# Altium footprint library 1MaxPcb.PcbLib: 187 footprints (part 10 of 12)
Each footprint in its own frame and in the unit in brackets; x right, y up, seen from the top. Pads: shape width x height; smd on the part's side, far side on the other; paste and mask are expansions set on the pad; w line width, h text height; cw(c..) or ccw(c..) is an arc to the next point about the centre after c.
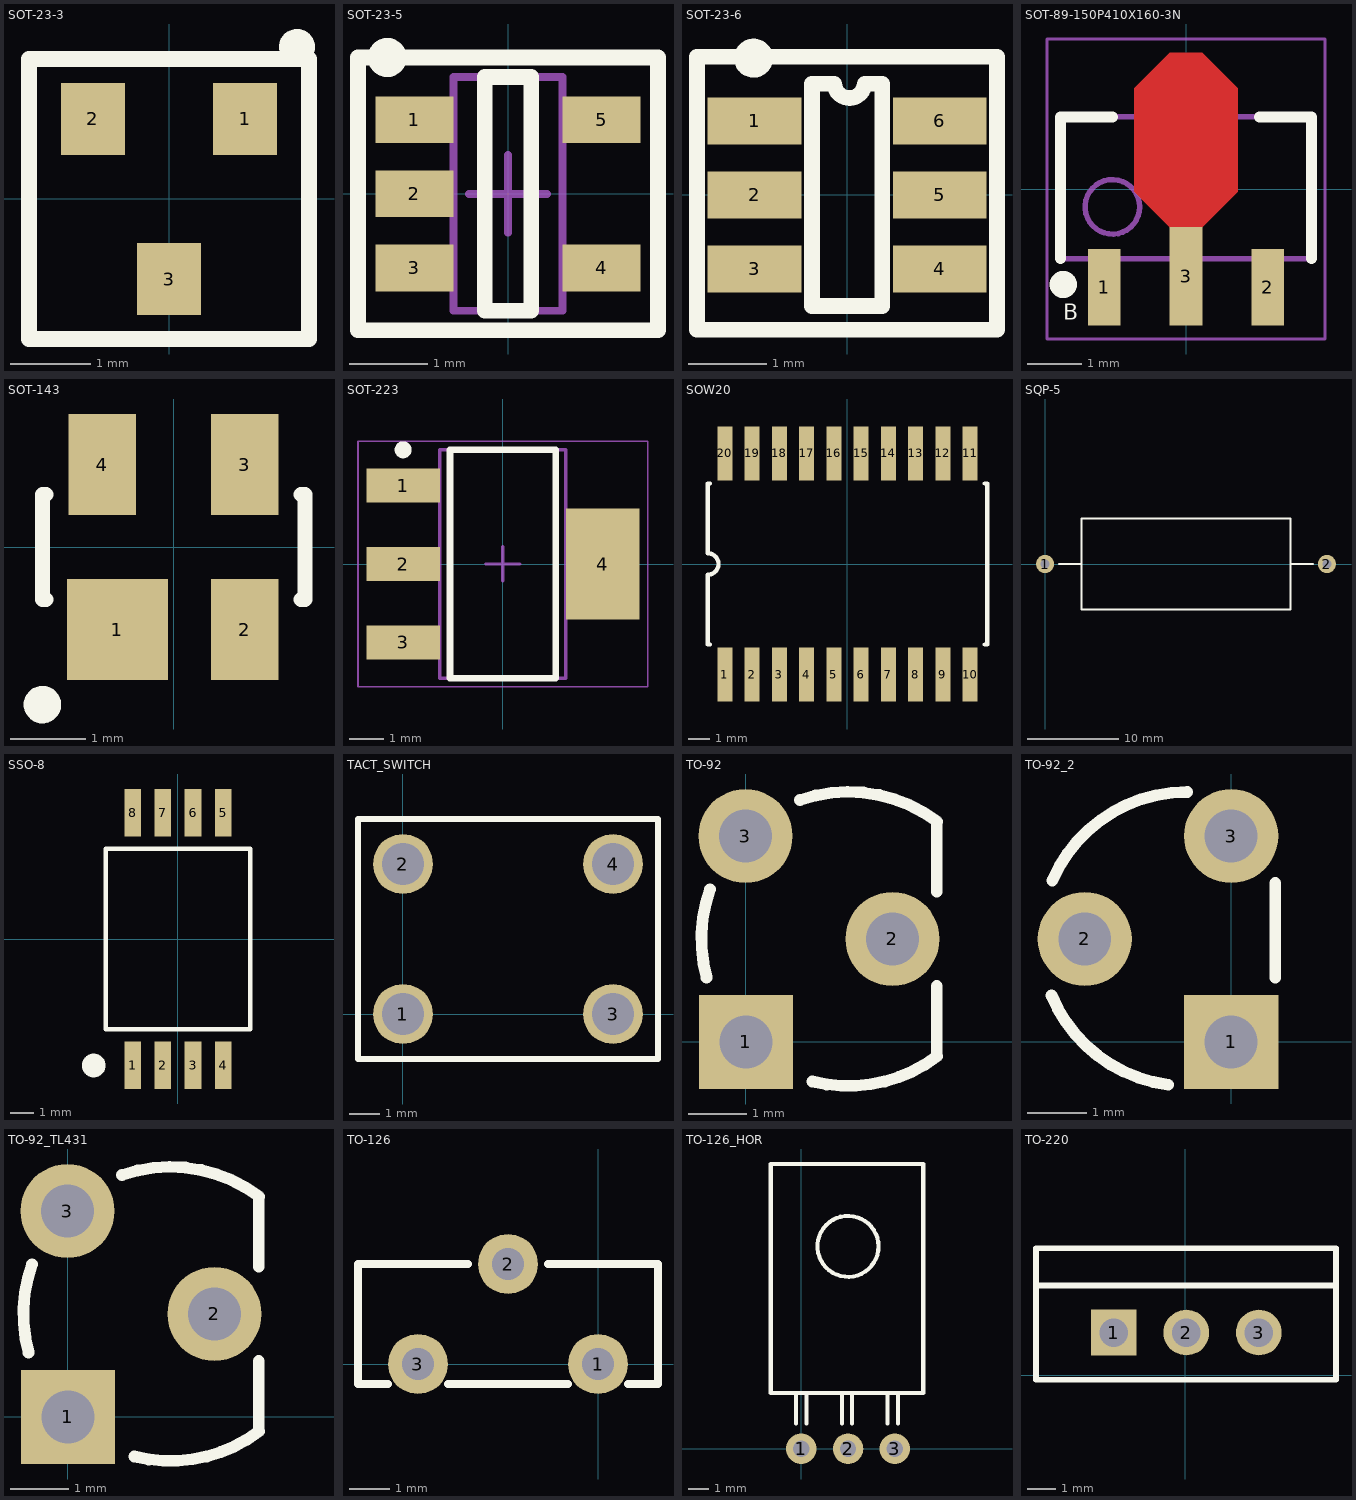
[diagram p9: the footprints below, top view; thin cyan lines are the x and y axes]

## SOT-23-3 [mm]
height 1.11
pads (3):
  rect 0.8x0.9 smd: 1(0.95,1) 2(-0.95,1) 3(0,-1)
Top Overlay:
  circle w0.25: c1.6,1.9 r0.1
  lines w0.2: -1.75,-1.75 1.75,-1.75 1.75,1.75 -1.5,1.75 -1.75,1.75 -1.75,-1.75
3D body "User Library-SOT-23-3-1.STEP": height 1.1, standoff 0, extent -1.5,-1.26 1.5,1.282

## SOT-23-5 [mm] "SOT23, 5-Leads, Body 2,90x2,45mm, Pitch 0,95mm, IPC Medium Density"
height 1.1
pads (5):
  rect 1x0.6 smd: 1(-1.2,0.95) 2(-1.2,0) 3(-1.2,-0.95) 4(1.2,-0.95) 5(1.2,0.95)
Top Overlay:
  circle w0.25: c-1.55,1.75 r0.125
  lines w0.2: -1.925,-1.75 -1.925,1.75 1.925,1.75 1.925,-1.75 -1.925,-1.75 ; -0.3,-1.5 -0.3,1.5 0.3,1.5 0.3,-1.5 -0.3,-1.5
Mechanical 13:
  lines w0.1: -0.7,-1.5 0.7,-1.5 0.7,1.5 -0.7,1.5 -0.7,-1.5
Mechanical 15:
  lines w0.1: -0.5,0 0.5,0 ; 0,-0.5 0,0.5
3D body "SOT25.step": height 1.1, standoff 0, extent -1.3,-1.5 1.3,1.5

## SOT-23-6 [mm]
height 1.45
pads (6):
  rect 1.2x0.6 smd mask+0.03: 1(-1.187,0.95) 2(-1.187,0) 3(-1.187,-0.95) 4(1.188,-0.95) 5(1.188,0) 6(1.188,0.95)
Top Overlay:
  circle w0.25: c-1.2,1.755 r0.125
  lines w0.2: -0.163,1.42 ccw(c0.031,1.439) 0.225,1.425 0.45,1.425 0.45,-1.425 -0.45,-1.425 -0.45,1.425 -0.163,1.425 ; -1.925,-1.728 1.925,-1.728 1.925,1.772 -1.925,1.772 -1.925,-1.728
3D body "SOT-23-6.STEP": height 1.45, standoff 0, extent -1.5,-1.525 1.5,1.525

## SOT-89-150P410X160-3N [mm] "SOT89, 3-Leads, Body 4,50x2,45mm, Pitch 1,50mm, Lead Span 4,1mm, IPC Medium Density"
height 1.6
pads (3):
  rect 0.6x1.4 smd: 1(-1.5,-1.8) 2(1.5,-1.8)
  rect 0.6x1.8 smd: 3(0,-1.6)
Top Layer:
  region: -0.3,-0.7 -0.95,-0.05 -0.95,1.85 -0.3,2.5 0.3,2.5 0.95,1.85 0.95,-0.05 0.3,-0.7
Top Overlay:
  circle w0.25: c-2.25,-1.75 r0.125
  lines w0.2: -2.3,-1.278 -2.3,1.322 -1.35,1.322 ; 1.35,1.322 2.3,1.322 2.3,-1.278
  text "B" at -2.25,-2.5 h0.5
Mechanical 13:
  circle w0.1: c-1.35,-0.327 r0.5
  lines w0.1: -2.3,-1.278 2.3,-1.278 2.3,1.322 -2.3,1.322 -2.3,-1.278
Mechanical 15:
  lines w0.05: -2.55,-2.75 2.55,-2.75 2.55,2.75 -2.55,2.75 -2.55,-2.75
  lines w0.1: -0.5,0.022 0.5,0.022 ; 0,-0.477 0,0.523
3D body: height 1.6, standoff 0, extent -2.3,-1.278 2.3,1.322
3D body "SOT89-3.STEP": height 1.54, standoff 0, extent -2.25,-2.25 2.25,2

## SOT-143 [mm] "SOT-143; 4 Leads; Body 3 x 2.6 mm, inc. leads (LxW max)"
height 1.1
pads (4):
  rect 1.35x1.35 smd: 1(-0.75,-1.1)
  rect 0.9x1.35 smd: 2(0.95,-1.1) 3(0.95,1.1) 4(-0.95,1.1)
Top Overlay:
  circle w0.25: c-1.75,-2.1 r0.125
  lines w0.2: -1.7,-0.7 -1.75,-0.7 -1.75,0.7 -1.7,0.7 ; 1.7,-0.7 1.75,-0.7 1.75,0.7 1.7,0.7

## SOT-223 [mm] "SOT223, 4-Leads, Body 6,50x7,00mm (avg), Pitch 2,30mm, IPC Medium Density"
height 1.8
pads (4):
  rect 2.15x1 smd: 1(-2.925,2.3) 2(-2.925,0) 3(-2.925,-2.3)
  rect 2.15x3.25 smd: 4(2.925,0)
Top Overlay:
  circle w0.25: c-2.925,3.35 r0.125
  lines w0.2: -1.55,-3.35 -1.55,3.35 1.55,3.35 1.55,-3.35 -1.55,-3.35
Mechanical 13:
  lines w0.1: -1.85,-3.35 -1.85,3.35 1.85,3.35 1.85,-3.35 -1.85,-3.35
Mechanical 15:
  lines w0.05: -4.25,-3.6 -4.25,3.6 4.25,3.6 4.25,-3.6 -4.25,-3.6
  lines w0.1: -0.5,0 0.5,0 ; 0,-0.5 0,0.5
3D body "SOT223.step": height 1.8, standoff 0, extent -3.5,-3.35 3.5,3.35

## SOW20 [mm]
pads (20):
  rect 0.7x2.5 smd: 1(-5.715,-5.15) 2(-4.445,-5.15) 3(-3.175,-5.15) 4(-1.905,-5.15) 5(-0.635,-5.15) 6(0.635,-5.15) 7(1.905,-5.15) 8(3.175,-5.15) 9(4.445,-5.15) 10(5.715,-5.15) 11(5.715,5.15) 12(4.445,5.15) 13(3.175,5.15) 14(1.905,5.15) 15(0.635,5.15) 16(-0.635,5.15) 17(-1.905,5.15) 18(-3.175,5.15) 19(-4.445,5.15) 20(-5.715,5.15)
Top Overlay:
  lines w0.2: -6.4,-3.75 -6.51,-3.75 -6.51,-0.5 ccw(c-6.51,0) -6.51,0.5 -6.51,3.75 -6.4,3.75 ; 6.4,-3.75 6.51,-3.75 6.51,3.75 6.4,3.75
3D body "SOIC-20.STEP": height 2.6, standoff 0, extent -6.3,-5.2 6.3,5.2

## SQP-5 [mm]
pads (2):
  round 2 hole 1: 1(0,0) 2(31,0)
Top Overlay:
  lines w0.2: 1.5,0 4,0 ; 27,0 29.5,0 ; 4,-5 4,5 27,5 27,-5 4,-5
3D body "RESAR3250W80L2200T1000H900_5W.STEP": height 9.8, standoff -1.7, extent -1.3,-5 32,5

## SSO-8 [mm]
pads (8):
  rect 0.7x2 smd: 1(-1.905,-5.325) 2(-0.635,-5.325) 3(0.635,-5.325) 4(1.905,-5.325) 5(1.905,5.325) 6(0.635,5.325) 7(-0.635,5.325) 8(-1.905,5.325)
Top Overlay:
  circle w0.5: c-3.556,-5.334 r0.25
  lines w0.2: -3.048,-3.81 3.048,-3.81 3.048,3.81 -3.048,3.81 -3.048,-3.81
3D body "User Library-SSO-8.step": height 3.36, standoff -0.02, extent -2.896,-5.75 2.954,5.75

## TACT_SWITCH [mm] "KLS7"
pads (4):
  round 2 hole 1.4: 1(0,0) 2(0,5) 3(7,0) 4(7,5)
Top Overlay:
  lines w0.2: -1.5,-1.5 -1.5,6.5 8.5,6.5 8.5,-1.5 -1.5,-1.5
3D body "User Library-Tactile switch 6x6x5mm.STEP": height 5.01, standoff -3.51, extent -0.371,-0.515 7.371,5.515

## TO-92 [mm] "TO, Flat Index; 3 In-Line, Axial Leads; Body Dia. 4.5mm; Leads 0.51 x 0.48 mm (max)"
height 6.86
pads (3):
  rect 1.6x1.6 hole 0.9: 1(0,0)
  round 1.6 hole 0.9: 2(2.491,1.75) 3(-0.007,3.499)
Top Overlay:
  lines w0.2: -0.668,1.092 cw(c1.744,1.751) -0.61,2.594 ; 0.921,4.112 cw(c1.744,1.751) 3.254,3.744 ; 1.129,-0.672 ccw(c1.744,1.751) 3.254,-0.242 ; 3.244,-0.229 3.244,0.951 ; 3.244,2.551 3.244,3.731
3D body "TO-92_SB254.step": height 11.5, standoff -1, extent -0.368,-0.75 3.742,4.25

## TO-92_2 [mm] "Axial Leads; Body Dia. 4.5mm; Leads 0.51 x 0.48 mm (max)"
pads (3):
  rect 1.6x1.6 hole 0.9: 1(0,0)
  round 1.6 hole 0.9: 2(-2.49,1.75) 3(0,3.5)
Top Overlay:
  lines w0.2: -3.055,0.791 ccw(c-0.747,1.751) -1.069,-0.728 ; -3.042,2.743 cw(c-0.747,1.751) -0.746,4.251 ; 0.749,1.091 0.749,2.704

## TO-92_TL431 [mm] "TO, Flat Index; 3 In-Line, Axial Leads; Body Dia. 4.5mm; Leads 0.51 x 0.48 mm (max)"
height 6.86
pads (3):
  rect 1.6x1.6 hole 0.9: 1(0,0)
  round 1.6 hole 0.9: 2(2.491,1.75) 3(-0.007,3.499)
Top Overlay:
  lines w0.2: -0.668,1.092 cw(c1.744,1.751) -0.61,2.594 ; 0.921,4.112 cw(c1.744,1.751) 3.254,3.744 ; 1.129,-0.672 ccw(c1.744,1.751) 3.254,-0.242 ; 3.244,-0.229 3.244,0.951 ; 3.244,2.551 3.244,3.731
3D body "TO-92_SB254.step": height 11.5, standoff -1, extent -0.368,-0.75 3.742,4.25

## TO-126 [mm] "ТО126 без радиатора"
height 10
pads (3):
  round 1.5 hole 0.8: 1(0,0) 2(-2.25,2.5) 3(-4.5,0)
Top Overlay:
  lines w0.2: -5.25,-0.5 -6,-0.5 -6,2.5 -3.25,2.5 ; -3.75,-0.5 -0.75,-0.5 ; -1.25,2.5 1.5,2.5 1.5,-0.5 0.75,-0.5

## TO-126_HOR [mm]
pads (3):
  round 1.5 hole 0.8: 1(0,0) 2(2.3,0) 3(4.6,0)
Top Overlay:
  circle w0.2: c2.3,9.951 r1.5
  lines w0.2: -0.25,1.25 -0.25,2.75 ; 0.25,1.25 0.25,2.75 ; 2,1.25 2,2.75 ; 2.5,1.25 2.5,2.75 ; 4.25,1.25 4.25,2.75 ; 4.75,1.25 4.75,2.75 ; -1.5,2.75 -1.5,14.001 5.75,14.001 6,14.001 6,2.75 -1.5,2.75

## TO-220 [mm] "TO220"
height 20
pads (3):
  rect 1.6x1.6 hole 1: 1(-2.5,1.5)
  round 1.6 hole 1: 2(0.04,1.5) 3(2.58,1.5)
Top Overlay:
  lines w0.2: -5.221,3.15 -5.221,-0.15 5.279,-0.15 5.279,1.5 5.279,3.15 ; -5.221,3.15 5.279,3.15 ; -5.221,3.15 -5.221,4.45 5.279,4.45 5.279,3.15
3D body "TO-220.step": height 22.66, standoff -1, extent -4.92,-0.61 5,3.925